# Altium footprint library eLIB.PcbLib: 206 footprints (part 12 of 13)
Each footprint in its own frame and in the unit in brackets; x right, y up, seen from the top. Pads: shape width x height; smd on the part's side, far side on the other; paste and mask are expansions set on the pad; w line width, h text height; cw(c..) or ccw(c..) is an arc to the next point about the centre after c.
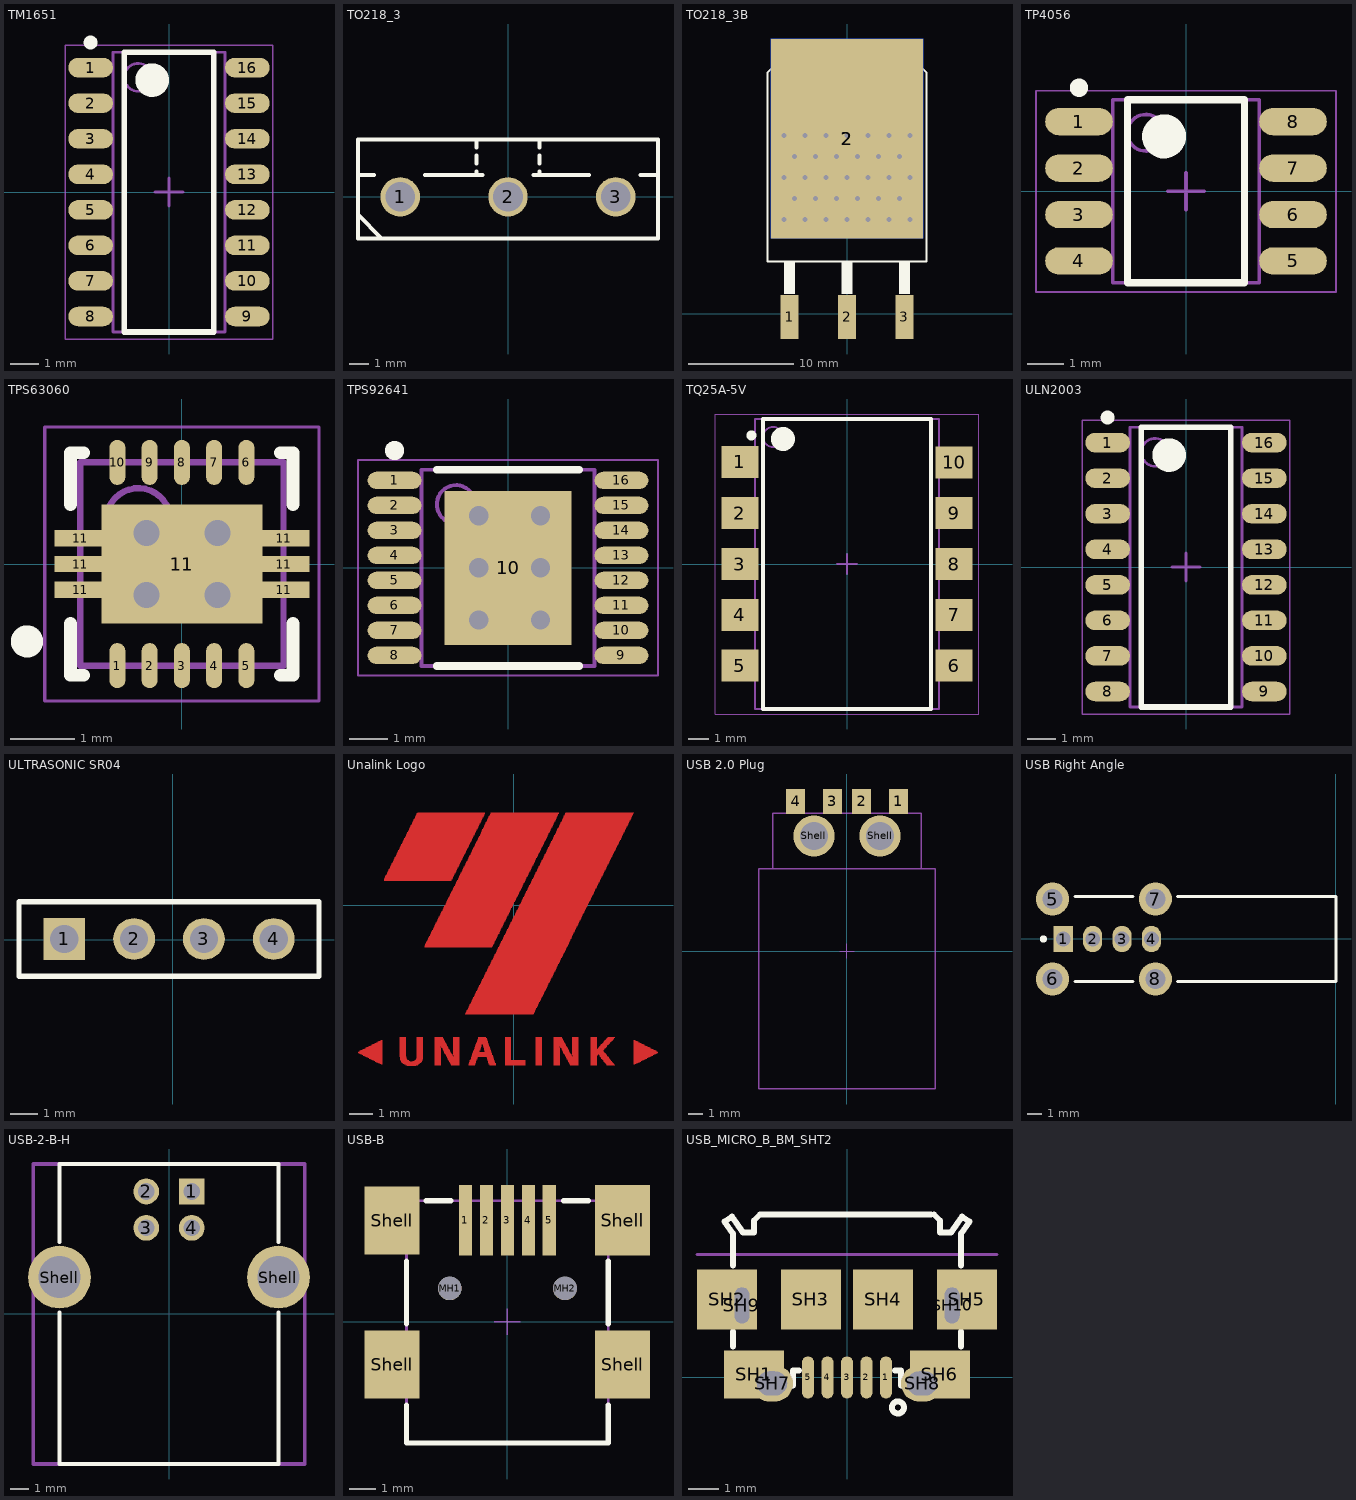
[diagram p11: the footprints below, top view; thin cyan lines are the x and y axes]

## TM1651 [mm] "SOP, 16-Leads, Body 9.90x3.90mm, Pitch 1.27mm, IPC Medium Density"
height 1.75
pads (16):
  oval 1.6x0.7 smd: 1(-2.8,4.445) 2(-2.8,3.175) 3(-2.8,1.905) 4(-2.8,0.635) 5(-2.8,-0.635) 6(-2.8,-1.905) 7(-2.8,-3.175) 8(-2.8,-4.445) 9(2.8,-4.445) 10(2.8,-3.175) 11(2.8,-1.905) 12(2.8,-0.635) 13(2.8,0.635) 14(2.8,1.905) 15(2.8,3.175) 16(2.8,4.445)
Top Overlay:
  circle w0.6: c-0.6,4 r0.3
  circle w0.25: c-2.8,5.345 r0.125
  lines w0.2: -1.6,-5 1.6,-5 1.6,5 -1.6,5 -1.6,-5
Mechanical 13:
  circle w0.1: c-1.1,4.1 r0.5
  lines w0.1: -2,-5 2,-5 2,5 -2,5 -2,-5
Mechanical 15:
  lines w0.05: -3.7,-5.25 3.7,-5.25 3.7,5.25 -3.7,5.25 -3.7,-5.25
  lines w0.1: -0.5,0 0.5,0 ; 0,-0.5 0,0.5
3D body: height 1.75, standoff 0.1, extent -2,-5 2,5

## TO218_3 [mm] "TO218, TO-218, SOT-93, pitch: 5.5mm"
pads (3):
  round 2 / inner round 2 / far side oval 2.4x3.6 hole 1.5: 1(-5.461,0) 2(0,0) 3(5.461,0)
Top Overlay:
  lines w0.2: -7.6,-0.9 -6.4,-2.1 ; -7.6,1.1 -6.8,1.1 ; -4.2,1.1 -1.3,1.1 ; -1.6,1.1 -1.6,1.3 ; -1.6,1.7 -1.6,2.1 ; -1.6,2.5 -1.6,2.9 ; 1.3,1.1 4.1,1.1 ; 1.6,1.1 1.6,1.3 ; 1.6,1.7 1.6,2.1 ; 1.6,2.5 1.6,2.9 ; 6.7,1.1 7.6,1.1 ; -7.6,-2.1 -7.6,2.9 7.6,2.9 7.6,-2.1 -7.6,-2.1
3D body "User Library-TO218.STEP": height 22.23, standoff -3, extent -7.475,-1.981 7.525,2.819

## TO218_3B [mm] "O218, TO-218, SOT-93, pitch: 5.5mm BENDED"
pads (5):
  rect 1.7x4.2 smd: 1(-5.48,-0.3) 2(0,-0.3) 3(5.48,-0.3)
  rect 14.5x19 smd: 2(0,16.701)
  rect 14.5x19 smd far side: 2(0,16.71)
via -6,17 diameter 0.8 hole 0.5
via -4,17 diameter 0.8 hole 0.5
via -2,17 diameter 0.8 hole 0.5
via 0,17 diameter 0.8 hole 0.5
via 2,17 diameter 0.8 hole 0.5
via 4,17 diameter 0.8 hole 0.5
via 6,17 diameter 0.8 hole 0.5
via 5,15 diameter 0.8 hole 0.5
via 3,15 diameter 0.8 hole 0.5
via 1,15 diameter 0.8 hole 0.5
via -1,15 diameter 0.8 hole 0.5
via -3,15 diameter 0.8 hole 0.5
via -5,15 diameter 0.8 hole 0.5
via -5,11 diameter 0.8 hole 0.5
via -3,11 diameter 0.8 hole 0.5
via -1,11 diameter 0.8 hole 0.5
via 1,11 diameter 0.8 hole 0.5
via 3,11 diameter 0.8 hole 0.5
via 5,11 diameter 0.8 hole 0.5
via 6,13 diameter 0.8 hole 0.5
via 4,13 diameter 0.8 hole 0.5
via 2,13 diameter 0.8 hole 0.5
via 0,13 diameter 0.8 hole 0.5
via -2,13 diameter 0.8 hole 0.5
via -4,13 diameter 0.8 hole 0.5
via -6,13 diameter 0.8 hole 0.5
via 6,9 diameter 0.8 hole 0.5
via 4,9 diameter 0.8 hole 0.5
via 2,9 diameter 0.8 hole 0.5
via 0,9 diameter 0.8 hole 0.5
via -2,9 diameter 0.8 hole 0.5
via -4,9 diameter 0.8 hole 0.5
via -6,9 diameter 0.8 hole 0.5
Top Overlay:
  rectangle: -0.508,1.9 0.508,5
  rectangle: -5.988,1.9 -4.972,5
  region: 5.988,5 4.972,5 4.972,1.9 5.988,1.9
  lines w0.2: -7.6,5 -7.6,23 -5.6,25 5.6,25 7.6,23 7.6,5 -7.6,5
Mechanical 1:
  circle w0.2: c0,21 r2
3D body "User Library-TO218-O.STEP": height 4.82, standoff -3, extent -7.499,-0.319 7.501,24.909

## TP4056 [mm] "SOIC, 8-Leads, Body 4.90x3.90mm, Pitch 1.27mm, IPC Medium Density"
height 1.35
pads (8):
  oval 1.85x0.75 smd: 1(-2.925,1.905) 2(-2.925,0.635) 3(-2.925,-0.635) 4(-2.925,-1.905) 5(2.925,-1.905) 6(2.925,-0.635) 7(2.925,0.635) 8(2.925,1.905)
Top Overlay:
  circle w0.25: c-2.925,2.83 r0.125
  circle w0.6: c-0.6,1.5 r0.3
  lines w0.2: -1.6,-2.5 -1.6,2.5 1.6,2.5 1.6,-2.5 -1.6,-2.5
Mechanical 13:
  circle w0.1: c-1.1,1.6 r0.5
  lines w0.1: -2,-2.5 -2,2.5 2,2.5 2,-2.5 -2,-2.5
Mechanical 15:
  lines w0.05: -4.1,-2.75 -4.1,2.75 4.1,2.75 4.1,-2.75 -4.1,-2.75
  lines w0.1: -0.5,0 0.5,0 ; 0,-0.5 0,0.5
3D body "LM358.step": height 1.35, standoff 0, extent -3.25,-2.5 3.25,2.5

## TPS63060 [mm] "QFN, 16-Leads, HIGH INPUT VOLTAGE BUCK-BOOST CONVERTER WITH 2A SWITCH CURRENT"
height 0.8
pads (17):
  oval 0.25x0.7 smd: 1(-1,-1.575) 2(-0.5,-1.575) 3(0,-1.575) 4(0.5,-1.575) 5(1,-1.575) 6(1,1.575) 7(0.5,1.575) 8(0,1.575) 9(-0.5,1.575) 10(-1,1.575)
  rect 0.8x0.25 smd: 11(-1.575,-0.4) 11(-1.575,0) 11(-1.575,0.4) 11(1.575,-0.4) 11(1.575,0) 11(1.575,0.4)
  rect 2.5x1.85 smd: 11(0,0)
via -0.55,0.48 diameter 0.8 hole 0.4
via 0.55,0.48 diameter 0.8 hole 0.4
via -0.55,-0.48 diameter 0.8 hole 0.4
via 0.55,-0.48 diameter 0.8 hole 0.4
Top Overlay:
  circle w0.25: c-2.4,-1.2 r0.125
  lines w0.2: -1.725,-0.925 -1.725,-1.725 -1.525,-1.725 ; -1.725,0.925 -1.725,1.725 -1.525,1.725 ; 1.525,-1.725 1.725,-1.725 1.725,-0.925 ; 1.525,1.725 1.725,1.725 1.725,0.925
Mechanical 13:
  circle w0.1: c-0.675,0.675 r0.5
  lines w0.1: -1.575,-1.575 -1.575,1.575 1.575,1.575 1.575,-1.575 -1.575,-1.575
Mechanical 15:
  lines w0.05: -2.125,-2.125 -2.125,2.125 2.125,2.125 2.125,-2.125 -2.125,-2.125
  lines w0.1: -0.5,0 0.5,0 ; 0,-0.5 0,0.5
3D body "TPS63060.step": height 0.8, standoff 0, extent -1.585,-1.585 1.585,1.585

## TPS92641 [mm] "TSOP, 16-Leads, Body 5.00x4.40mm, Pitch 0.65mm, Thermal Pad 3.30x3.30mm, IPC Medium Density"
height 1.2
pads (17):
  oval 1.4x0.45 smd: 1(-2.95,2.275) 2(-2.95,1.625) 3(-2.95,0.975) 4(-2.95,0.325) 5(-2.95,-0.325) 6(-2.95,-0.975) 7(-2.95,-1.625) 8(-2.95,-2.275) 9(2.95,-2.275) 10(2.95,-1.625) 11(2.95,-0.975) 12(2.95,-0.325) 13(2.95,0.325) 14(2.95,0.975) 15(2.95,1.625) 16(2.95,2.275)
  rect 3.3x4 smd: 10(0,0)
via -0.762,-1.354 diameter 1 hole 0.5
via -0.762,0 diameter 1 hole 0.5
via -0.762,1.354 diameter 1 hole 0.5
via 0.846,1.354 diameter 1 hole 0.5
via 0.846,0 diameter 1 hole 0.5
via 0.846,-1.354 diameter 1 hole 0.5
Top Overlay:
  circle w0.25: c-2.95,3.05 r0.125
  lines w0.2: -1.85,-2.55 1.85,-2.55 ; -1.85,2.55 1.85,2.55
Mechanical 13:
  circle w0.1: c-1.35,1.65 r0.5
  lines w0.1: -2.25,-2.55 2.25,-2.55 2.25,2.55 -2.25,2.55 -2.25,-2.55
Mechanical 15:
  lines w0.05: -3.9,-2.8 3.9,-2.8 3.9,2.8 -3.9,2.8 -3.9,-2.8
  lines w0.1: -0.5,0 0.5,0 ; 0,-0.5 0,0.5
3D body: height 1.2, standoff 0.05, extent -2.25,-2.55 2.25,2.55

## TQ25A-5V [mm] "SOP, 10-Leads, Body 14.00x9.05mm, Pitch 2.54mm, IPC Medium Density"
height 5.6
pads (10):
  rect 1.85x1.6 smd: 1(-5.36,5.11) 2(-5.36,2.54) 3(-5.36,0) 4(-5.36,-2.54) 5(-5.36,-5.08) 6(5.36,-5.08) 7(5.36,-2.54) 8(5.36,0) 9(5.36,2.54) 10(5.36,5.08)
Top Overlay:
  circle w0.25: c-4.78,6.43 r0.125
  circle w0.6: c-3.2,6.25 r0.3
  lines w0.2: -4.2,-7.25 -4.2,7.25 4.2,7.25 4.2,-7.25 -4.2,-7.25
Mechanical 13:
  circle w0.1: c-3.7,6.35 r0.5
  lines w0.1: -4.6,-7.25 -4.6,7.25 4.6,7.25 4.6,-7.25 -4.6,-7.25
Mechanical 15:
  lines w0.05: -6.6,-7.5 -6.6,7.5 6.6,7.5 6.6,-7.5 -6.6,-7.5
  lines w0.1: -0.5,0 0.5,0 ; 0,-0.5 0,0.5
3D body: height 5.6, standoff 0.2, extent -4.6,-7.25 4.6,7.25

## ULN2003 [mm] "SOP, 16-Leads, Body 9.90x3.90mm, Pitch 1.27mm, IPC Medium Density"
height 1.75
pads (16):
  oval 1.6x0.7 smd: 1(-2.8,4.445) 2(-2.8,3.175) 3(-2.8,1.905) 4(-2.8,0.635) 5(-2.8,-0.635) 6(-2.8,-1.905) 7(-2.8,-3.175) 8(-2.8,-4.445) 9(2.8,-4.445) 10(2.8,-3.175) 11(2.8,-1.905) 12(2.8,-0.635) 13(2.8,0.635) 14(2.8,1.905) 15(2.8,3.175) 16(2.8,4.445)
Top Overlay:
  circle w0.6: c-0.6,4 r0.3
  circle w0.25: c-2.8,5.345 r0.125
  lines w0.2: -1.6,-5 1.6,-5 1.6,5 -1.6,5 -1.6,-5
Mechanical 13:
  circle w0.1: c-1.1,4.1 r0.5
  lines w0.1: -2,-5 2,-5 2,5 -2,5 -2,-5
Mechanical 15:
  lines w0.05: -3.7,-5.25 3.7,-5.25 3.7,5.25 -3.7,5.25 -3.7,-5.25
  lines w0.1: -0.5,0 0.5,0 ; 0,-0.5 0,0.5
3D body: height 1.75, standoff 0.1, extent -2,-5 2,5

## ULTRASONIC SR04 [mm] "HC - SR04 Ultrasonic module"
pads (4):
  rect 1.52x1.52 hole 1.02: 1(-3.947,0.034)
  round 1.52 hole 1.02: 2(-1.407,0.034) 3(1.133,0.034) 4(3.673,0.034)
Top Overlay:
  lines w0.2: -5.592,-1.316 -5.592,1.384 5.318,1.384 5.318,-1.316 -5.592,-1.316
3D body "User Library-ultra-son HC-SR04.STEP": height 20.4, standoff 0, extent -22.68,-14.953 22.62,1.087

## Unalink Logo [mm]
Top Layer:
  lines w0.025: -6.648,-6.272 -5.606,-6.272 ; -6.622,-6.297 -5.606,-6.297 ; -6.622,-6.246 -5.606,-6.246 ; -6.572,-6.322 -5.606,-6.322 ; -6.572,-6.221 -5.606,-6.221 ; -6.521,-6.348 -5.606,-6.348 ; -6.521,-6.195 -5.606,-6.195 ; -6.47,-6.373 -5.606,-6.373 ; -6.47,-6.17 -5.606,-6.17 ; -6.419,-6.399 -5.606,-6.399 ; -6.419,-6.145 -5.606,-6.145 ; -6.368,-6.424 -5.606,-6.424 ; -6.368,-6.119 -5.606,-6.119 ; -6.318,-6.449 -5.606,-6.449 ; -6.318,-6.094 -5.606,-6.094 ; -6.267,-6.475 -5.606,-6.475 ; -6.267,-6.068 -5.606,-6.068 ; -6.216,-6.5 -5.606,-6.5 ; -6.216,-6.043 -5.606,-6.043 ; -6.165,-6.526 -5.606,-6.526 ; -6.165,-6.018 -5.606,-6.018 ; -6.114,-6.551 -5.606,-6.551 ; -6.114,-5.992 -5.606,-5.992 ; -6.064,-6.576 -5.606,-6.576 ; -6.064,-5.967 -5.606,-5.967 ; -6.013,-6.602 -5.606,-6.602 ; -6.013,-5.941 -5.606,-5.941 ; -5.962,-6.627 -5.606,-6.627 ; -5.962,-5.916 -5.606,-5.916 ; -5.911,-6.653 -5.606,-6.653 ; -5.911,-5.891 -5.606,-5.891 ; -5.86,-6.678 -5.606,-6.678 ; -5.86,-5.865 -5.606,-5.865 ; -5.81,-6.703 -5.606,-6.703 ; -5.81,-5.84 -5.606,-5.84 ; -5.759,-6.729 -5.606,-6.729 ; -5.759,-5.814 -5.606,-5.814 ; -5.708,-6.754 -5.606,-6.754 ; -5.708,-5.789 -5.606,-5.789 ; -5.657,-6.78 -5.606,-6.78 ; -5.657,-5.764 -5.606,-5.764 ; -5.53,1.069 -2.66,1.069 ; -5.53,1.094 -2.66,1.094 ; -5.53,1.12 -2.635,1.12 ; -5.505,1.145 -2.635,1.145 ; -5.505,1.171 -2.609,1.171 ; -5.479,1.196 -2.609,1.196 ; -5.479,1.221 -2.584,1.221 ; -5.454,1.247 -2.584,1.247 ; -5.454,1.272 -2.558,1.272 ; -5.429,1.298 -2.558,1.298 ; -5.429,1.323 -2.533,1.323 ; -5.403,1.348 -2.533,1.348 ; -5.403,1.374 -2.508,1.374 ; -5.378,1.399 -2.508,1.399 ; -5.378,1.425 -2.482,1.425 ; -5.352,1.45 -2.482,1.45 ; -5.352,1.475 -2.457,1.475 ; -5.327,1.501 -2.457,1.501 ; -5.327,1.526 -2.431,1.526 ; -5.302,1.552 -2.431,1.552 ; -5.302,1.577 -2.406,1.577 ; -5.276,1.602 -2.406,1.602 ; -5.276,1.628 -2.381,1.628 ; -5.251,1.653 -2.381,1.653 ; -5.251,1.679 -2.355,1.679 ; -5.225,1.704 -2.355,1.704 ; -5.225,1.729 -2.33,1.729 ; -5.2,1.755 -2.33,1.755 ; -5.2,1.78 -2.304,1.78 ; -5.175,1.806 -2.304,1.806 ; -5.175,1.831 -2.279,1.831 ; -5.149,1.856 -2.279,1.856 ; -5.149,1.882 -2.254,1.882 ; -5.124,1.907 -2.254,1.907 ; -5.124,1.933 -2.228,1.933 ; -5.098,1.958 -2.228,1.958 ; -5.098,1.983 -2.203,1.983 ; -5.073,2.009 -2.203,2.009 ; -5.073,2.034 -2.177,2.034 ; -5.048,2.06 -2.177,2.06 ; -5.048,2.085 -2.152,2.085 ; -5.022,2.11 -2.152,2.11 ; -5.022,2.136 -2.127,2.136 ; -4.997,2.161 -2.127,2.161 ; -4.997,2.187 -2.101,2.187 ; -4.971,2.212 -2.101,2.212 ; -4.971,2.237 -2.076,2.237 ; -4.946,2.263 -2.076,2.263 ; -4.946,2.288 -2.05,2.288 ; -4.921,2.314 -2.05,2.314 ; -4.921,2.339 -2.025,2.339 ; -4.895,2.364 -2.025,2.364 ; -4.895,2.39 -2,2.39 ; -4.87,-6.449 -4.616,-6.449 ; -4.87,-6.424 -4.616,-6.424 ; -4.87,-6.399 -4.616,-6.399 ; -4.87,-6.373 -4.616,-6.373 ; -4.87,-6.348 -4.616,-6.348 ; -4.87,-6.322 -4.616,-6.322 ; -4.87,-6.297 -4.616,-6.297 ; -4.87,-6.272 -4.616,-6.272 ; -4.87,-6.246 -4.616,-6.246 ; -4.87,-6.221 -4.616,-6.221 ; -4.87,-6.195 -4.616,-6.195 ; -4.87,-6.17 -4.616,-6.17 ; -4.87,-6.145 -4.616,-6.145 ; -4.87,-6.119 -4.616,-6.119 ; -4.87,-6.094 -4.616,-6.094 ; -4.87,-6.068 -4.616,-6.068 ; -4.87,-6.043 -4.616,-6.043 ; -4.87,-6.018 -4.616,-6.018 ; -4.87,-5.992 -4.616,-5.992 ; -4.87,-5.967 -4.616,-5.967 ; -4.87,-5.941 -4.616,-5.941 ; -4.87,-5.916 -4.616,-5.916 ; -4.87,-5.891 -4.616,-5.891 ; -4.87,-5.865 -4.616,-5.865 ; -4.87,-5.84 -4.616,-5.84 ; -4.87,-5.814 -4.616,-5.814 ; -4.87,-5.789 -4.616,-5.789 ; -4.87,-5.764 -4.616,-5.764 ; -4.87,-5.738 -4.616,-5.738 ; -4.87,-5.713 -4.616,-5.713 ; -4.87,-5.687 -4.616,-5.687 ; -4.87,-5.662 -4.616,-5.662 ; -4.87,-5.637 -4.616,-5.637 ; -4.87,2.415 -2,2.415 ; -4.87,2.441 -1.974,2.441 ; -4.844,-6.576 -4.565,-6.576 ; -4.844,-6.551 -4.565,-6.551 ; -4.844,-6.526 -4.59,-6.526 ; -4.844,-6.5 -4.59,-6.5 ; -4.844,-6.475 -4.59,-6.475 ; -4.844,2.466 -1.974,2.466 ; -4.844,2.491 -1.949,2.491 ; -4.819,-6.627 -4.489,-6.627 ; -4.819,-6.602 -4.54,-6.602 ; -4.819,2.517 -1.949,2.517 ; -4.819,2.542 -1.923,2.542 ; -4.794,-6.678 -3.955,-6.678 ; -4.794,-6.653 -4.438,-6.653 ; -4.794,2.568 -1.923,2.568 ; -4.794,2.593 -1.898,2.593 ; -4.768,-6.703 -3.981,-6.703 ; -4.768,2.618 -1.898,2.618 ; -4.768,2.644 -1.873,2.644 ; -4.743,-6.729 -4.006,-6.729 ; -4.743,2.669 -1.873,2.669 ; -4.743,2.695 -1.847,2.695 ; -4.717,-6.754 -4.032,-6.754 ; -4.717,2.72 -1.847,2.72 ; -4.717,2.745 -1.822,2.745 ; -4.692,2.771 -1.822,2.771 ; -4.692,2.796 -1.796,2.796 ; -4.667,-6.78 -4.057,-6.78 ; -4.667,2.822 -1.796,2.822 ; -4.667,2.847 -1.771,2.847 ; -4.641,2.872 -1.771,2.872 ; -4.641,2.898 -1.746,2.898 ; -4.616,-6.805 -4.108,-6.805 ; -4.616,2.923 -1.746,2.923 ; -4.616,2.949 -1.72,2.949 ; -4.59,2.974 -1.72,2.974 ; -4.59,2.999 -1.695,2.999 ; -4.565,3.025 -1.695,3.025 ; -4.565,3.05 -1.669,3.05 ; -4.54,-6.83 -4.184,-6.83 ; -4.54,3.076 -1.669,3.076 ; -4.54,3.101 -1.644,3.101 ; -4.514,3.126 -1.644,3.126 ; -4.514,3.152 -1.619,3.152 ; -4.489,3.177 -1.619,3.177 ; -4.489,3.203 -1.593,3.203 ; -4.463,3.228 -1.593,3.228 ; -4.463,3.253 -1.568,3.253 ; -4.438,3.279 -1.568,3.279 ; -4.438,3.304 -1.542,3.304 ; -4.413,3.33 -1.542,3.33 ; -4.413,3.355 -1.517,3.355 ; -4.387,3.38 -1.517,3.38 ; -4.387,3.406 -1.492,3.406 ; -4.362,3.431 -1.492,3.431 ; -4.362,3.457 -1.466,3.457 ; -4.336,3.482 -1.466,3.482 ; -4.336,3.507 -1.441,3.507 ; -4.311,-6.653 -3.93,-6.653 ; -4.311,3.533 -1.441,3.533 ; -4.311,3.558 -1.415,3.558 ; -4.286,3.584 -1.415,3.584 ; -4.286,3.609 -1.39,3.609 ; -4.26,3.634 -1.39,3.634 ; -4.26,3.66 -1.365,3.66 ; -4.235,-6.627 -3.905,-6.627 ; -4.235,3.685 -1.365,3.685 ; -4.235,3.711 -1.339,3.711 ; -4.209,3.736 -1.339,3.736 ; -4.209,3.761 -1.314,3.761 ; -4.184,-6.602 -3.905,-6.602 ; -4.184,3.787 -1.314,3.787 ; -4.184,3.812 -1.288,3.812 ; -4.159,-6.576 -3.905,-6.576 ; -4.159,-6.551 -3.879,-6.551 ; -4.159,3.838 -1.288,3.838 ; -4.159,3.863 -1.263,3.863 ; -4.133,-6.526 -3.879,-6.526 ; -4.133,-6.5 -3.879,-6.5 ; -4.133,-6.475 -3.879,-6.475 ; -4.133,-6.449 -3.879,-6.449 ; -4.133,-6.424 -3.879,-6.424 ; -4.133,-6.399 -3.879,-6.399 ; -4.133,-6.373 -3.879,-6.373 ; -4.133,-6.348 -3.879,-6.348 ; -4.133,-6.322 -3.879,-6.322 ; -4.133,-6.297 -3.879,-6.297 ; -4.133,-6.272 -3.879,-6.272 ; -4.133,-6.246 -3.879,-6.246 ; -4.133,-6.221 -3.879,-6.221 ; -4.133,-6.195 -3.879,-6.195 ; -4.133,-6.17 -3.879,-6.17 ; -4.133,-6.145 -3.879,-6.145 ; -4.133,-6.119 -3.879,-6.119 ; -4.133,-6.094 -3.879,-6.094 ; -4.133,-6.068 -3.879,-6.068 ; -4.133,-6.043 -3.879,-6.043 ; -4.133,-6.018 -3.879,-6.018 ; -4.133,-5.992 -3.879,-5.992 ; -4.133,-5.967 -3.879,-5.967 ; -4.133,-5.941 -3.879,-5.941 ; -4.133,-5.916 -3.879,-5.916 ; -4.133,-5.891 -3.879,-5.891 ; -4.133,-5.865 -3.879,-5.865 ; -4.133,-5.84 -3.879,-5.84 ; -4.133,-5.814 -3.879,-5.814 ; -4.133,-5.789 -3.879,-5.789 ; -4.133,-5.764 -3.879,-5.764 ; -4.133,-5.738 -3.879,-5.738 ; -4.133,-5.713 -3.879,-5.713 ; -4.133,-5.687 -3.879,-5.687 ; -4.133,-5.662 -3.879,-5.662 ; -4.133,-5.637 -3.879,-5.637 ; -4.133,3.888 -1.263,3.888 ; -4.133,3.914 -1.238,3.914 ; -4.108,3.939 -1.238,3.939 ; -3.803,-1.776 -0.933,-1.776 ; -3.803,-1.75 -0.933,-1.75 ; -3.803,-1.725 -0.907,-1.725 ; -3.778,-1.7 -0.907,-1.7 ; -3.778,-1.674 -0.882,-1.674 ; -3.752,-1.649 -0.882,-1.649 ; -3.752,-1.623 -0.857,-1.623 ; -3.727,-1.598 -0.831,-1.598 ; -3.727,-1.573 -0.831,-1.573 ; -3.701,-1.547 -0.831,-1.547 ; -3.701,-1.522 -0.806,-1.522 ; -3.676,-1.496 -0.806,-1.496 ; -3.676,-1.471 -0.78,-1.471 ; -3.651,-1.446 -0.78,-1.446 ; -3.651,-1.42 -0.755,-1.42 ; -3.625,-1.395 -0.755,-1.395 ; -3.625,-1.369 -0.73,-1.369 ; -3.6,-1.344 -0.73,-1.344 ; -3.6,-1.319 -0.704,-1.319 ; -3.574,-1.293 -0.704,-1.293 ; -3.574,-1.268 -0.679,-1.268 ; -3.549,-1.242 -0.679,-1.242 ; -3.549,-1.217 -0.653,-1.217 ; -3.524,-1.192 -0.628,-1.192 ; -3.524,-1.166 -0.628,-1.166 ; -3.498,-1.141 -0.628,-1.141 ; -3.498,-1.115 -0.603,-1.115 ; -3.473,-1.09 -0.603,-1.09 ; -3.473,-1.065 -0.577,-1.065 ; -3.447,-1.039 -0.577,-1.039 ; -3.447,-1.014 -0.552,-1.014 ; -3.422,-0.988 -0.552,-0.988 ; -3.422,-0.963 -0.526,-0.963 ; -3.397,-0.938 -0.526,-0.938 ; -3.397,-0.912 -0.501,-0.912 ; -3.371,-6.805 -3.117,-6.805 ; -3.371,-6.78 -3.117,-6.78 ; -3.371,-6.754 -3.117,-6.754 ; -3.371,-6.729 -3.117,-6.729 ; -3.371,-6.703 -3.117,-6.703 ; -3.371,-6.678 -3.117,-6.678 ; -3.371,-6.653 -3.117,-6.653 ; -3.371,-6.627 -3.117,-6.627 ; -3.371,-6.602 -3.117,-6.602 ; -3.371,-6.576 -3.117,-6.576 ; -3.371,-6.551 -3.117,-6.551 ; -3.371,-6.526 -3.117,-6.526 ; -3.371,-6.5 -3.117,-6.5 ; -3.371,-6.475 -3.117,-6.475 ; -3.371,-6.449 -3.117,-6.449 ; -3.371,-6.424 -3.117,-6.424 ; -3.371,-6.399 -3.117,-6.399 ; -3.371,-6.373 -3.117,-6.373 ; -3.371,-6.348 -3.117,-6.348 ; -3.371,-6.322 -3.117,-6.322 ; -3.371,-6.297 -3.117,-6.297 ; -3.371,-6.272 -3.117,-6.272 ; -3.371,-6.246 -3.117,-6.246 ; -3.371,-6.221 -3.117,-6.221 ; -3.371,-6.195 -3.117,-6.195 ; -3.371,-6.17 -3.117,-6.17 ; -3.371,-6.145 -3.117,-6.145 ; -3.371,-6.119 -3.117,-6.119 ; -3.371,-6.094 -3.117,-6.094 ; -3.371,-6.068 -3.143,-6.068 ; -3.371,-6.043 -3.143,-6.043 ; -3.371,-6.018 -3.143,-6.018 ; -3.371,-5.992 -3.143,-5.992 ; -3.371,-5.967 -3.143,-5.967 ; -3.371,-5.941 -2.889,-5.941 ; -3.371,-5.916 -2.889,-5.916 ; -3.371,-5.891 -2.914,-5.891 ; -3.371,-5.865 -2.914,-5.865 ; -3.371,-5.84 -2.939,-5.84 ; -3.371,-5.814 -2.939,-5.814 ; -3.371,-5.789 -2.965,-5.789 ; -3.371,-5.764 -2.965,-5.764 ; -3.371,-5.738 -2.99,-5.738 ; -3.371,-5.713 -2.99,-5.713 ; -3.371,-5.687 -3.016,-5.687 ; -3.371,-5.662 -3.041,-5.662 ; -3.371,-5.637 -3.041,-5.637 ; -3.371,-0.887 -0.501,-0.887 ; -3.371,-0.861 -0.476,-0.861 ; -3.346,-0.836 -0.476,-0.836 ; -3.346,-0.811 -0.45,-0.811 ; -3.32,-0.785 -0.45,-0.785 ; -3.32,-0.76 -0.425,-0.76 ; -3.295,-0.734 -0.425,-0.734 ; -3.295,-0.709 -0.399,-0.709 ; -3.27,-0.684 -0.399,-0.684 ; -3.27,-0.658 -0.374,-0.658 ; -3.244,-0.633 -0.374,-0.633 ; -3.244,-0.607 -0.349,-0.607 ; -3.219,-0.582 -0.349,-0.582 ; -3.219,-0.557 -0.323,-0.557 ; -3.193,-0.531 -0.323,-0.531 ; -3.193,-0.506 -0.298,-0.506 ; -3.168,-0.48 -0.298,-0.48 ; -3.168,-0.455 -0.272,-0.455 ; -3.143,-0.43 -0.272,-0.43 ; -3.143,-0.404 -0.247,-0.404 ; -3.117,-5.992 -2.863,-5.992 ; -3.117,-5.967 -2.863,-5.967 ; -3.117,-0.379 -0.247,-0.379 ; -3.117,-0.353 -0.222,-0.353 ; -3.092,-6.043 -2.812,-6.043 ; -3.092,-6.018 -2.838,-6.018 ; -3.092,-0.328 -0.222,-0.328 ; -3.092,-0.303 -0.196,-0.303 ; -3.066,-6.068 -2.812,-6.068 ; -3.066,-0.277 -0.196,-0.277 ; -3.066,-0.252 -0.171,-0.252 ; -3.041,-6.119 -2.787,-6.119 ; -3.041,-6.094 -2.787,-6.094 ; -3.041,-0.226 -0.171,-0.226 ; -3.041,-0.201 -0.145,-0.201 ; -3.016,-6.17 -2.762,-6.17 ; -3.016,-6.145 -2.762,-6.145 ; -3.016,-0.176 -0.145,-0.176 ; -3.016,-0.15 -0.12,-0.15 ; -2.99,-6.221 -2.736,-6.221 ; -2.99,-6.195 -2.736,-6.195 ; -2.99,-0.125 -0.12,-0.125 ; -2.99,-0.099 -0.095,-0.099 ; -2.965,-6.272 -2.711,-6.272 ; -2.965,-6.246 -2.711,-6.246 ; -2.965,-0.074 -0.095,-0.074 ; -2.965,-0.049 -0.069,-0.049 ; -2.939,-6.322 -2.66,-6.322 ; -2.939,-6.297 -2.685,-6.297 ; -2.939,-0.023 -0.069,-0.023 ; -2.939,0.002 -0.044,0.002 ; -2.914,-6.373 -2.635,-6.373 ; -2.914,-6.348 -2.66,-6.348 ; -2.914,0.028 -0.044,0.028 ; -2.914,0.053 -0.018,0.053 ; -2.889,-6.399 -2.635,-6.399 ; -2.889,0.078 -0.018,0.078 ; -2.889,0.104 0.007,0.104 ; -2.863,-6.449 -2.609,-6.449 ; -2.863,-6.424 -2.609,-6.424 ; -2.863,0.129 0.007,0.129 ; -2.863,0.155 0.032,0.155 ; -2.838,-6.5 -2.584,-6.5 ; -2.838,-6.475 -2.584,-6.475 ; -2.838,0.18 0.032,0.18 ; -2.838,0.205 0.058,0.205 ; -2.812,-6.551 -2.33,-6.551 ; -2.812,-6.526 -2.33,-6.526 ; -2.812,0.231 0.058,0.231 ; -2.812,0.256 0.083,0.256 ; -2.787,-6.602 -2.33,-6.602 ; -2.787,-6.576 -2.33,-6.576 ; -2.787,0.282 0.083,0.282 ; -2.787,0.307 0.109,0.307 ; -2.762,-6.653 -2.33,-6.653 ; -2.762,-6.627 -2.33,-6.627 ; -2.762,0.332 0.109,0.332 ; -2.762,0.358 0.134,0.358 ; -2.736,-6.678 -2.33,-6.678 ; -2.736,0.383 0.134,0.383 ; -2.736,0.409 0.159,0.409 ; -2.711,-6.729 -2.33,-6.729 ; -2.711,-6.703 -2.33,-6.703 ; -2.711,0.434 0.159,0.434 ; -2.711,0.459 0.185,0.459 ; -2.685,-6.78 -2.33,-6.78 ; -2.685,-6.754 -2.33,-6.754 ; -2.685,0.485 0.185,0.485 ; -2.685,0.51 0.21,0.51 ; -2.66,-6.805 -2.33,-6.805 ; -2.66,0.536 0.21,0.536 ; -2.66,0.561 0.236,0.561 ; -2.635,0.586 0.236,0.586 ; -2.635,0.612 0.261,0.612 ; -2.609,0.637 0.261,0.637 ; -2.609,0.663 0.286,0.663 ; -2.584,-6.373 -2.33,-6.373 ; -2.584,-6.348 -2.33,-6.348 ; -2.584,-6.322 -2.33,-6.322 ; -2.584,-6.297 -2.33,-6.297 ; -2.584,-6.272 -2.33,-6.272 ; -2.584,-6.246 -2.33,-6.246 ; -2.584,-6.221 -2.33,-6.221 ; -2.584,-6.195 -2.33,-6.195 ; -2.584,-6.17 -2.33,-6.17 ; -2.584,-6.145 -2.33,-6.145 ; -2.584,-6.119 -2.33,-6.119 ; -2.584,-6.094 -2.33,-6.094 ; -2.584,-6.068 -2.33,-6.068 ; -2.584,-6.043 -2.33,-6.043 ; -2.584,-6.018 -2.33,-6.018 ; -2.584,-5.992 -2.33,-5.992 ; -2.584,-5.967 -2.33,-5.967 ; -2.584,-5.941 -2.33,-5.941 ; -2.584,-5.916 -2.33,-5.916 ; -2.584,-5.891 -2.33,-5.891 ; -2.584,-5.865 -2.33,-5.865 ; -2.584,-5.84 -2.33,-5.84 ; -2.584,-5.814 -2.33,-5.814 ; -2.584,-5.789 -2.33,-5.789 ; -2.584,-5.764 -2.33,-5.764 ; -2.584,-5.738 -2.33,-5.738 ; -2.584,-5.713 -2.33,-5.713 ; -2.584,-5.687 -2.33,-5.687 ; -2.584,-5.662 -2.33,-5.662 ; -2.584,-5.637 -2.33,-5.637 ; -2.584,0.688 0.286,0.688 ; -2.584,0.713 0.312,0.713 ; -2.558,-6.5 -2.33,-6.5 ; -2.558,-6.475 -2.33,-6.475 ; -2.558,-6.449 -2.33,-6.449 ; -2.558,-6.424 -2.33,-6.424 ; -2.558,-6.399 -2.33,-6.399 ; -2.558,0.739 0.312,0.739 ; -2.558,0.764 0.337,0.764 ; -2.533,0.79 0.337,0.79 ; -2.533,0.815 0.363,0.815 ; -2.508,0.84 0.363,0.84 ; -2.508,0.866 0.388,0.866 ; -2.482,0.891 0.388,0.891 ; -2.482,0.917 0.413,0.917 ; -2.457,0.942 0.413,0.942 ; -2.457,0.967 0.439,0.967 ; -2.431,0.993 0.439,0.993 ; -2.431,1.018 0.464,1.018 ; -2.406,1.044 0.464,1.044 ; -2.406,1.069 0.49,1.069 ; -2.381,1.094 0.49,1.094 ; -2.381,1.12 0.515,1.12 ; -2.355,1.145 0.515,1.145 ; -2.355,1.171 0.54,1.171 ; -2.33,1.196 0.54,1.196 ; -2.33,1.221 0.566,1.221 ; -2.304,1.247 0.566,1.247 ; -2.304,1.272 0.591,1.272 ; -2.279,1.298 0.591,1.298 ; -2.279,1.323 0.617,1.323 ; -2.254,1.348 0.617,1.348 ; -2.254,1.374 0.642,1.374 ; -2.228,1.399 0.642,1.399 ; -2.228,1.425 0.667,1.425 ; -2.203,1.45 0.667,1.45 ; -2.203,1.475 0.693,1.475 ; -2.177,1.501 0.693,1.501 ; -2.177,1.526 0.718,1.526 ; -2.152,1.552 0.718,1.552 ; -2.152,1.577 0.744,1.577 ; -2.127,1.602 0.744,1.602 ; -2.127,1.628 0.769,1.628 ; -2.101,1.653 0.769,1.653 ; -2.101,1.679 0.794,1.679 ; -2.076,-4.646 0.82,-4.646 ; -2.076,1.704 0.794,1.704 ; -2.076,1.729 0.82,1.729 ; -2.05,-4.621 0.845,-4.621 ; -2.05,-4.595 0.845,-4.595 ; -2.05,1.755 0.82,1.755 ; -2.05,1.78 0.845,1.78 ; -2.025,-4.57 0.871,-4.57 ; -2.025,-4.544 0.871,-4.544 ; -2.025,1.806 0.845,1.806 ; -2.025,1.831 0.871,1.831 ; -2,-4.519 0.896,-4.519 ; -2,-4.494 0.896,-4.494 ; -2,1.856 0.871,1.856 ; -2,1.882 0.896,1.882 ; -1.974,-4.468 0.921,-4.468 ; -1.974,-4.443 0.921,-4.443 ; -1.974,1.907 0.896,1.907 ; -1.974,1.933 0.921,1.933 ; -1.949,-4.417 0.947,-4.417 ; -1.949,-4.392 0.947,-4.392 ; -1.949,1.958 0.921,1.958 ; -1.949,1.983 0.947,1.983 ; -1.923,-6.805 -1.669,-6.805 ; -1.923,-6.78 -1.644,-6.78 ; -1.923,-4.367 0.972,-4.367 ; -1.923,-4.341 0.972,-4.341 ; -1.923,2.009 0.947,2.009 ; -1.923,2.034 0.972,2.034 ; -1.898,-6.754 -1.644,-6.754 ; -1.898,-6.729 -1.644,-6.729 ; -1.898,-6.703 -1.619,-6.703 ; -1.898,-4.316 0.998,-4.316 ; -1.898,-4.29 0.998,-4.29 ; -1.898,2.06 0.972,2.06 ; -1.898,2.085 0.998,2.085 ; -1.873,-6.678 -1.619,-6.678 ; -1.873,-6.653 -1.619,-6.653 ; -1.873,-6.627 -1.593,-6.627 ; -1.873,-4.265 1.023,-4.265 ; -1.873,-4.24 1.023,-4.24 ; -1.873,2.11 0.998,2.11 ; -1.873,2.136 1.023,2.136 ; -1.847,-6.602 -1.593,-6.602 ; -1.847,-6.576 -1.593,-6.576 ; -1.847,-4.214 1.048,-4.214 ; -1.847,-4.189 1.048,-4.189 ; -1.847,2.161 1.023,2.161 ; -1.847,2.187 1.048,2.187 ; -1.822,-6.551 -1.568,-6.551 ; -1.822,-6.526 -1.568,-6.526 ; -1.822,-6.5 -1.568,-6.5 ; -1.822,-4.163 1.074,-4.163 ; -1.822,-4.138 1.074,-4.138 ; -1.822,2.212 1.048,2.212 ; -1.822,2.237 1.074,2.237 ; -1.796,-6.475 -1.542,-6.475 ; -1.796,-6.449 -0.907,-6.449 ; -1.796,-6.424 -0.907,-6.424 ; -1.796,-4.113 1.099,-4.113 ; -1.796,-4.087 1.099,-4.087 ; -1.796,2.263 1.074,2.263 ; -1.796,2.288 1.099,2.288 ; -1.771,-6.399 -0.907,-6.399 ; -1.771,-6.373 -0.933,-6.373 ; -1.771,-6.348 -0.933,-6.348 ; -1.771,-4.062 1.125,-4.062 ; -1.771,-4.036 1.125,-4.036 ; -1.771,2.314 1.099,2.314 ; -1.771,2.339 1.125,2.339 ; -1.746,-6.322 -0.933,-6.322 ; -1.746,-6.297 -0.958,-6.297 ; -1.746,-4.011 1.15,-4.011 ; -1.746,-3.986 1.15,-3.986 ; -1.746,2.364 1.125,2.364 ; -1.746,2.39 1.15,2.39 ; -1.72,-6.272 -0.958,-6.272 ; -1.72,-6.246 -1.466,-6.246 ; -1.72,-6.221 -1.466,-6.221 ; -1.72,-3.96 1.175,-3.96 ; -1.72,-3.935 1.175,-3.935 ; -1.72,2.415 1.15,2.415 ; -1.72,2.441 1.175,2.441 ; -1.695,-6.195 -1.466,-6.195 ; -1.695,-6.17 -1.441,-6.17 ; -1.695,-6.145 -1.441,-6.145 ; -1.695,-3.909 1.201,-3.909 ; -1.695,-3.884 1.201,-3.884 ; -1.695,2.466 1.175,2.466 ; -1.695,2.491 1.201,2.491 ; -1.669,-6.119 -1.441,-6.119 ; -1.669,-6.094 -1.415,-6.094 ; -1.669,-6.068 -1.415,-6.068 ; -1.669,-3.859 1.226,-3.859 ; -1.669,-3.833 1.226,-3.833 ; -1.669,2.517 1.201,2.517 ; -1.669,2.542 1.226,2.542 ; -1.644,-6.043 -1.415,-6.043 ; -1.644,-6.018 -1.39,-6.018 ; -1.644,-5.992 -1.39,-5.992 ; -1.644,-3.808 1.252,-3.808 ; -1.644,-3.782 1.252,-3.782 ; -1.644,2.568 1.226,2.568 ; -1.644,2.593 1.252,2.593 ; -1.619,-5.967 -1.39,-5.967 ; -1.619,-5.941 -1.39,-5.941 ; -1.619,-3.757 1.277,-3.757 ; -1.619,-3.732 1.277,-3.732 ; -1.619,2.618 1.252,2.618 ; -1.619,2.644 1.277,2.644 ; -1.593,-5.916 -1.365,-5.916 ; -1.593,-5.891 -1.365,-5.891 ; -1.593,-5.865 -1.365,-5.865 ; -1.593,-3.706 1.302,-3.706 ; -1.593,-3.681 1.302,-3.681 ; -1.593,2.669 1.277,2.669 ; -1.593,2.695 1.302,2.695 ; -1.568,-5.84 -1.111,-5.84 ; -1.568,-5.814 -1.111,-5.814 ; -1.568,-5.789 -1.136,-5.789 ; -1.568,-3.655 1.328,-3.655 ; -1.568,-3.63 1.328,-3.63 ; -1.568,2.72 1.302,2.72 ; -1.568,2.745 1.328,2.745 ; -1.542,-5.764 -1.136,-5.764 ; -1.542,-5.738 -1.136,-5.738 ; -1.542,-5.713 -1.161,-5.713 ; -1.542,-3.605 1.353,-3.605 ; -1.542,-3.579 1.353,-3.579 ; -1.542,2.771 1.328,2.771 ; -1.542,2.796 1.353,2.796 ; -1.517,-5.687 -1.161,-5.687 ; -1.517,-5.662 -1.187,-5.662 ; -1.517,-5.637 -1.187,-5.637 ; -1.517,-3.554 1.379,-3.554 ; -1.517,-3.528 1.379,-3.528 ; -1.517,2.822 1.353,2.822 ; -1.517,2.847 1.379,2.847 ; -1.492,-3.503 1.404,-3.503 ; -1.492,-3.478 1.404,-3.478 ; -1.492,2.872 1.379,2.872 ; -1.492,2.898 1.404,2.898 ; -1.466,-3.452 1.429,-3.452 ; -1.466,-3.427 1.429,-3.427 ; -1.466,2.923 1.404,2.923 ; -1.466,2.949 1.429,2.949 ; -1.441,-3.401 1.455,-3.401 ; -1.441,-3.376 1.455,-3.376 ; -1.441,2.974 1.429,2.974 ; -1.441,2.999 1.455,2.999 ; -1.415,-3.351 1.48,-3.351 ; -1.415,-3.325 1.48,-3.325 ; -1.415,3.025 1.455,3.025 ; -1.415,3.05 1.48,3.05 ; -1.39,-3.3 1.506,-3.3 ; -1.39,-3.274 1.506,-3.274 ; -1.39,3.076 1.48,3.076 ; -1.39,3.101 1.506,3.101 ; -1.365,-3.249 1.531,-3.249 ; -1.365,-3.224 1.531,-3.224 ; -1.365,3.126 1.506,3.126 ; -1.365,3.152 1.531,3.152 ; -1.365,3.177 1.531,3.177 ; -1.339,-5.916 -1.085,-5.916 ; -1.339,-5.891 -1.085,-5.891 ; -1.339,-5.865 -1.111,-5.865 ; -1.339,-3.198 1.556,-3.198 ; -1.339,-3.173 1.556,-3.173 ; -1.339,3.203 1.556,3.203 ; -1.339,3.228 1.556,3.228 ; -1.314,-5.992 -1.06,-5.992 ; -1.314,-5.967 -1.06,-5.967 ; -1.314,-5.941 -1.085,-5.941 ; -1.314,-3.147 1.582,-3.147 ; -1.314,-3.122 1.582,-3.122 ; -1.314,3.253 1.582,3.253 ; -1.314,3.279 1.582,3.279 ; -1.288,-6.068 -1.034,-6.068 ; -1.288,-6.043 -1.034,-6.043 ; -1.288,-6.018 -1.06,-6.018 ; -1.288,-3.097 1.607,-3.097 ; -1.288,-3.071 1.607,-3.071 ; -1.288,3.304 1.607,3.304 ; -1.288,3.33 1.607,3.33 ; -1.263,-6.17 -1.009,-6.17 ; -1.263,-6.145 -1.009,-6.145 ; -1.263,-6.119 -1.009,-6.119 ; -1.263,-6.094 -1.034,-6.094 ; -1.263,-3.046 1.633,-3.046 ; -1.263,-3.02 1.633,-3.02 ; -1.263,3.355 1.633,3.355 ; -1.263,3.38 1.633,3.38 ; -1.238,-6.246 -0.958,-6.246 ; -1.238,-6.221 -0.984,-6.221 ; -1.238,-6.195 -0.984,-6.195 ; -1.238,-2.995 1.658,-2.995 ; -1.238,-2.97 1.658,-2.97 ; -1.238,3.406 1.658,3.406 ; -1.238,3.431 1.658,3.431 ; -1.212,-2.944 1.683,-2.944 ; -1.212,-2.919 1.683,-2.919 ; -1.212,3.457 1.683,3.457 ; -1.212,3.482 1.683,3.482 ; -1.187,-2.893 1.709,-2.893 ; -1.187,-2.868 1.709,-2.868 